# Altium footprint library SIM_Sockets.PCBLIB: 16 footprints
Each footprint in its own frame and in the unit in brackets; x right, y up, seen from the top. Pads: shape width x height; smd on the part's side, far side on the other; paste and mask are expansions set on the pad; w line width, h text height; cw(c..) or ccw(c..) is an arc to the next point about the centre after c.
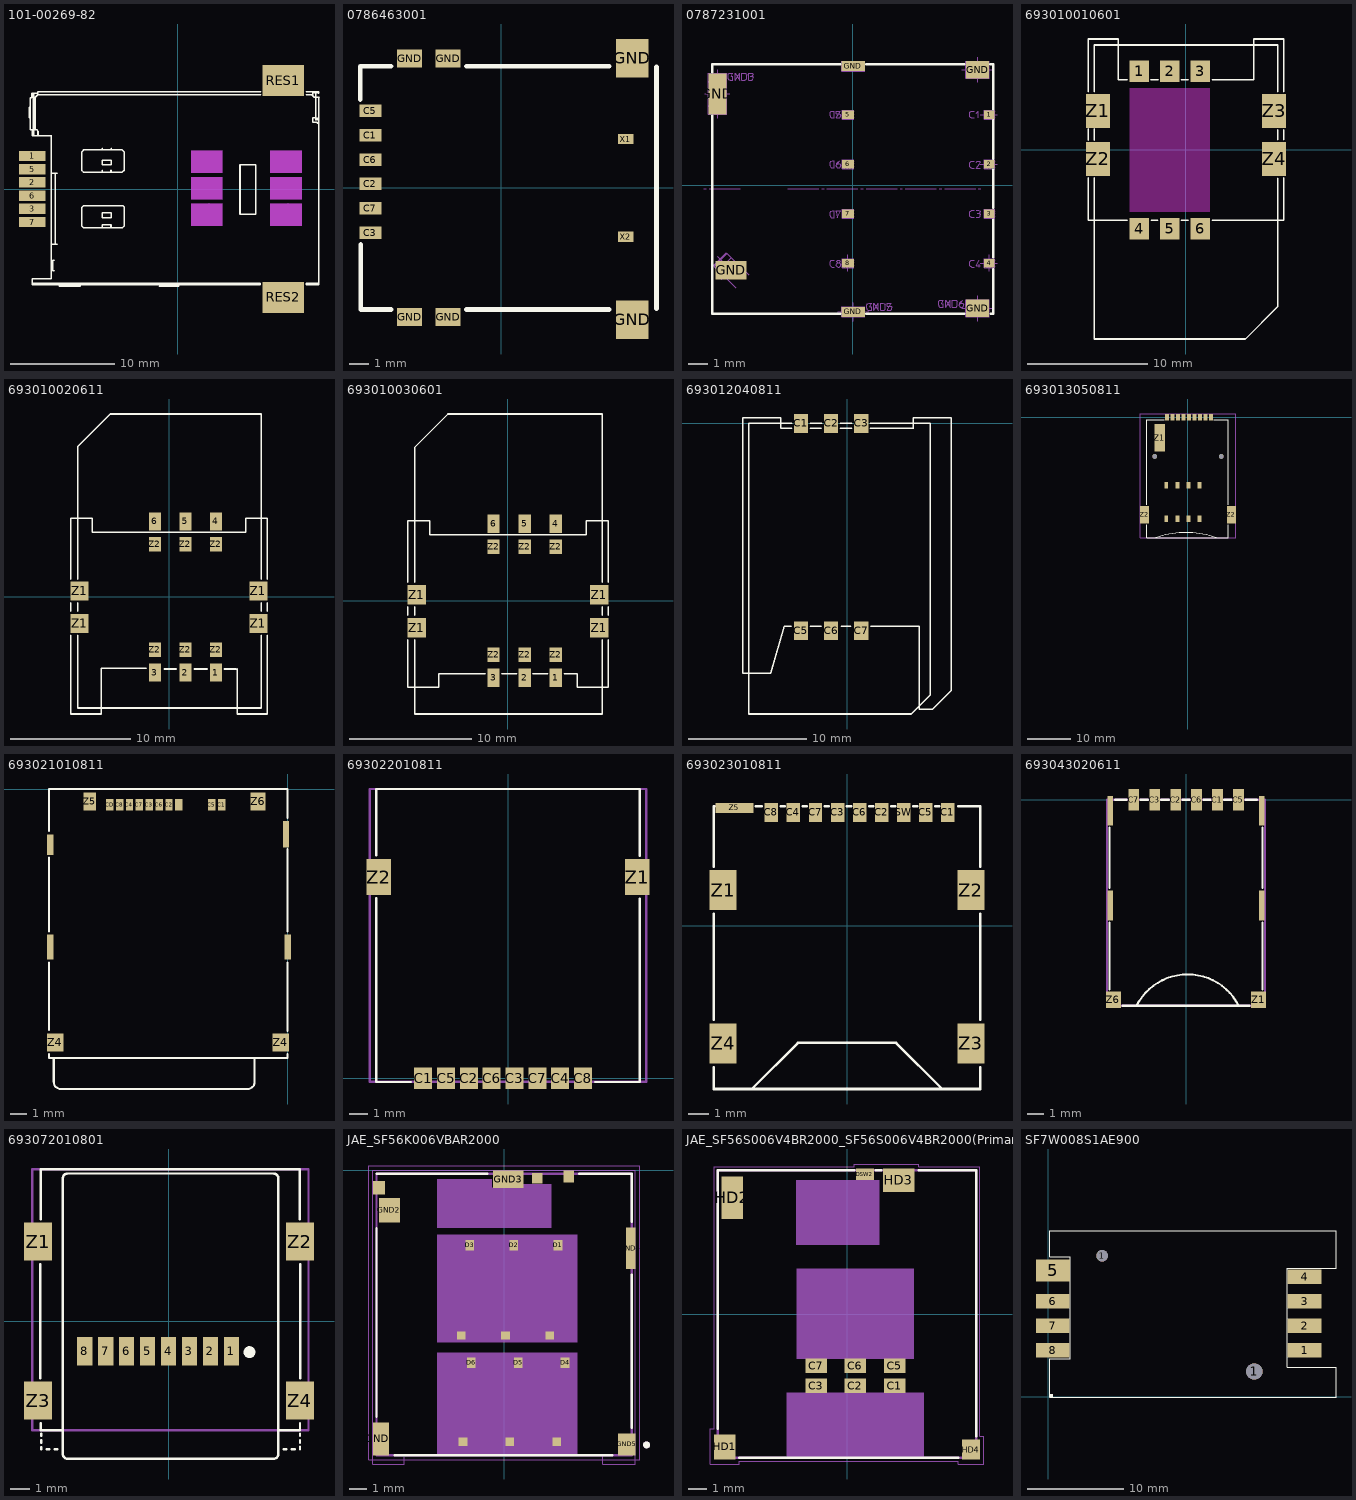
[diagram p0: the footprints below, top view; thin cyan lines are the x and y axes]

## 101-00269-82 [mm]
pads (8):
  rect 2.54x1 smd: 1(-13.97,3.175) 2(-13.97,0.635) 3(-13.97,-1.905) 5(-13.97,1.905) 6(-13.97,-0.635) 7(-13.97,-3.175)
  rect 4x3 smd: RES1(10.16,10.414) RES2(10.16,-10.414)
Top Overlay:
  lines w0.152: -14.275,6.833 -14.275,7.849 ; -13.97,-9.042 7.95,-9.042 7.95,-9.195 -13.97,-9.195 -13.97,-8.611 -12.141,-8.611 -12.141,5.105 -12.167,5.131 -13.411,5.131 ; -13.792,5.156 -13.818,5.131 ; -12.141,-5.309 -11.582,-5.309 -11.76,-5.309 -11.76,1.499 ; -12.141,1.499 -11.582,1.499 ; -11.862,-7.874 -12.014,-7.874 -12.014,-6.858 -11.862,-6.858 ; -11.354,-9.322 -9.347,-9.322 ; -7.239,-3.658 -7.239,-3.429 -6.401,-3.429 -6.401,-3.708 ; -7.239,1.702 -7.239,1.803 ; -7.239,3.81 -7.239,3.912 ; -6.426,1.676 -6.401,1.702 -6.401,1.803 ; -6.375,3.785 -6.375,3.912 ; -1.778,-9.347 0.076,-9.347 0.127,-9.296 ; 7.976,9.068 -13.437,9.068 ; 7.976,9.347 -13.437,9.347 -13.437,9.068 ; 12.37,9.068 12.878,9.068 12.979,8.966 ; 12.37,9.347 13.538,9.347 13.538,9.22 13.513,9.246 13.005,9.246 12.979,9.22 12.979,8.966 ; 13.31,6.807 13.564,6.807 13.437,6.68 13.513,6.68 13.538,6.655 13.284,6.655 13.259,6.68 13.259,9.246 13.284,9.22 13.284,6.833 12.979,6.833 12.979,6.426 13.411,6.426 13.411,6.299 13.564,6.299 ; 13.513,-9.042 12.37,-9.042 12.37,-9.195 13.564,-9.195 13.564,6.299 ; -13.818,5.131 -13.97,5.131 -13.97,5.639 -13.995,5.664 -13.97,5.69 -13.691,5.69 ; -13.818,5.131 -13.843,5.156 -13.843,9.22 -13.83,9.207 -13.437,9.207 -13.449,9.195 -13.995,9.195 -13.995,8.788 -14.148,8.788 -14.148,5.69 -13.691,5.69 ; -13.818,5.131 -13.411,5.131 ; -13.691,5.69 -13.538,5.69 -13.411,5.563 -13.411,5.131 ; -13.691,5.69 -13.691,8.814 -13.437,9.068 ; 12.979,8.966 13.132,8.814 13.589,8.814 13.564,8.788 13.564,6.299 ; -9.22,-3.556 -9.068,-3.708 -5.283,-3.708 -5.131,-3.556 -5.131,-1.727 -5.258,-1.6 -9.042,-1.6 -9.22,-1.778 -9.22,-3.556 ; -9.195,1.778 -9.042,1.626 -5.309,1.626 -5.131,1.803 -5.131,3.556 -5.334,3.759 -9.017,3.759 -9.195,3.581 -9.195,1.778 ; -7.239,-2.743 -6.375,-2.743 -6.375,-2.311 -6.401,-2.286 -7.239,-2.286 -7.239,-2.743 ; -7.239,2.311 -6.375,2.311 -6.375,2.743 -6.375,2.769 -7.239,2.769 -7.239,2.311 ; 5.994,-2.438 7.518,-2.438 7.518,2.311 5.994,2.311 5.994,-2.438
Mechanical 8 keep-out:
  rectangle: 1.27,1.524 4.318,3.683
  rectangle: 1.27,-1.016 4.318,1.143
  rectangle: 1.27,-3.556 4.318,-1.397
  rectangle: 8.89,1.524 11.938,3.683
  rectangle: 8.89,-1.016 11.938,1.143
  rectangle: 8.89,-3.556 11.938,-1.397
Mechanical 16:
  drawing of 931 lines, arcs and shapes, not listed
3D body "101-00306-82-SIM_holder.step": height 1.95, standoff 0, extent -14.097,-10.135 13.753,10.065

## 0786463001 [mm] "Conn Micro SIM Card SKT 6 POS 2.54mm Solder RA SMD Embossed T/R 0.5A/Contact"
pads (14):
  rect 1.15x0.65 smd: C1(-6.807,2.743) C2(-6.807,0.203) C3(-6.807,-2.337) C5(-6.807,4.013) C6(-6.807,1.473) C7(-6.807,-1.067)
  rect 1.3x0.95 smd: GND(-4.775,-6.725) GND(-4.775,6.725) GND(-2.769,-6.725) GND(-2.769,6.725)
  rect 1.7x2 smd: GND(6.807,-6.865) GND(6.807,6.745)
  rect 0.8x0.54 smd: X1(6.477,2.54) X2(6.477,-2.54)
Top Overlay:
  lines w0.254: -7.341,4.597 -7.341,6.325 -7.315,6.325 -5.74,6.325 ; -7.315,-2.947 -7.315,-6.325 -5.74,-6.325 ; -1.803,-6.325 5.613,-6.325 ; -1.803,6.324 5.613,6.325 ; 8.077,-6.274 8.077,6.299
3D body "786463001.stp": height 1.46, standoff 0.01, extent -7.369,-6.528 8.081,6.522

## 0787231001 [mm]
pads (14):
  rect 0.54x0.45 smd: 1(7.002,3.616) 2(7.002,1.076) 3(7.002,-1.464) 4(7.002,-4.004)
  rect 0.6x0.45 smd: 5(-0.25,3.616) 6(-0.25,1.076) 7(-0.25,-1.464) 8(-0.25,-4.004)
  rect 0.94x2.1 smd: GND(-6.943,4.683)
  rect 1.6x0.94 smd: GND(-6.244,-4.36)
  rect 1.2x0.52 smd: GND(0.017,-6.493) GND(0.017,6.105)
  rect 1.2x0.89 smd: GND(6.392,-6.303) GND(6.392,5.927)
Top Overlay:
  lines w0.127: -7.212,-2.2 -7.212,-6.587 -0.657,-6.587 ; -7.212,-2.175 -7.212,3.556 ; -7.212,5.8 -7.212,6.205 ; -7.203,6.205 -0.644,6.205 ; -5.898,6.205 -5.79,6.205 ; -5.645,6.205 -5.536,6.205 ; -5.382,6.205 -4.222,6.205 ; -4.077,6.205 -3.969,6.205 ; -3.815,6.205 -3.715,6.205 ; -3.561,6.205 -2.402,6.205 ; -2.247,6.205 -2.148,6.205 ; -1.994,6.205 -1.885,6.205 ; 0.679,6.205 5.721,6.205 ; 0.692,-6.587 4.545,-6.587 ; 4.547,-6.587 5.721,-6.587 ; 7.057,6.205 7.192,6.205 ; 7.069,-6.587 7.192,-6.587 7.192,-4.298 ; 7.192,-5.545 7.192,-5.463 ; 7.192,-5.337 7.192,-5.255 ; 7.192,-3.706 7.192,-1.762 ; 7.192,-1.169 7.192,0.788 ; 7.192,1.368 7.192,3.324 ; 7.192,3.904 7.192,6.196 ; 7.192,4.873 7.192,4.955 ; 7.192,5.082 7.192,5.154
Mechanical 113:
  drawing of 527 lines, arcs and shapes, not listed
3D body "787231001.stp": height 1.33, standoff -0.01, extent -7.243,-6.581 7.177,6.219

## 693010010601 [mm] "WR-CRD Mini SIM_Standard Header 6 pins    1.7 Heigth"
height 1.7
pads (10):
  rect 1.6x1.8 smd: 1(-3.9,6.55) 2(-1.36,6.55) 3(1.18,6.55) 4(-3.9,-6.55) 5(-1.36,-6.55) 6(1.18,-6.55)
  rect 2x2.8 smd: Z1(-7.35,3.25) Z2(-7.35,-0.75) Z3(7.35,3.25) Z4(7.35,-0.75)
Top Overlay:
  lines w0.127: -8.15,-2.3 -8.15,-5.85 -4.9,-5.85 ; -8.15,0.8 -8.15,1.75 ; -8.15,4.85 -8.15,9.25 -5.65,9.25 -5.65,5.85 -4.9,5.85 ; -7.65,-2.3 -7.65,-15.75 4.95,-15.75 7.65,-13.05 7.65,-2.35 ; -7.65,0.8 -7.65,1.75 ; -7.65,4.85 -7.65,8.75 7.65,8.75 7.65,4.85 ; -2.95,5.85 -2.3,5.85 ; -2.9,-5.85 -2.35,-5.85 ; -0.4,-5.85 0.2,-5.85 ; -0.4,5.85 0.2,5.85 ; 2.2,-5.85 8.15,-5.85 8.15,-2.3 ; 2.2,5.85 5.65,5.85 5.65,9.25 8.15,9.25 8.15,4.85 ; 7.65,0.85 7.65,1.7 ; 8.15,0.85 8.15,1.7
Keep-Out Layer:
  rectangle: -4.7,-5.15 1.98,5.15
3D body "693010010601.stp": height 1.71, standoff -0.04, extent -8.15,-6.85 8.15,9.25

## 693010020611 [mm] "WR-CRD Mini SIM_header_Shielded_6 pins    1.8 Heigth"
height 1.8
pads (16):
  rect 1x1.5 smd: 1(3.9,-6.3) 2(1.36,-6.3) 3(-1.18,-6.3) 4(3.9,6.3) 5(1.36,6.3) 6(-1.18,6.3)
  rect 1.5x1.6 smd: Z1(-7.45,-2.2) Z1(-7.45,0.5) Z1(7.45,-2.2) Z1(7.45,0.5)
  rect 1x1.2 smd: Z2(-1.18,-4.4) Z2(-1.18,4.4) Z2(1.36,-4.4) Z2(1.36,4.4) Z2(3.9,-4.4) Z2(3.9,4.4)
Top Overlay:
  lines w0.127: -8.2,-3.2 -8.2,-9.75 -5.63,-9.75 -5.63,-5.95 -1.9,-5.95 ; -8.2,-1.2 -8.2,-0.5 ; -8.2,1.5 -8.2,6.55 -6.4,6.55 -6.4,5.4 6.4,5.4 6.4,6.55 8.2,6.55 8.2,1.5 ; -7.6,-3.2 -7.6,-9.25 7.7,-9.25 7.7,-3.2 ; -7.6,-1.2 -7.6,-0.5 ; -7.6,1.5 -7.6,12.55 -4.9,15.25 7.7,15.25 7.7,1.5 ; -0.4,-6 0.6,-6 ; 2.1,-6 3.2,-6 ; 4.6,-6 5.62,-6 ; 5.67,-6 5.67,-9.75 8.2,-9.75 8.2,-3.2 ; 7.7,-1.2 7.7,-0.5 ; 8.2,-1.2 8.2,-0.5
3D body "693010020611.stp": height 1.81, standoff -0.04, extent -8.2,-9.75 8.2,6.55

## 693010030601 [mm] "WR-CRD Mini SIM_Card Stop_header_Shielded_ W/O card stop   6 pins    1.8 Heigth"
height 1.8
pads (16):
  rect 1x1.5 smd: 1(3.9,-6.3) 2(1.36,-6.3) 3(-1.18,-6.3) 4(3.9,6.3) 5(1.36,6.3) 6(-1.18,6.3)
  rect 1.5x1.6 smd: Z1(-7.45,-2.2) Z1(-7.45,0.5) Z1(7.45,-2.2) Z1(7.45,0.5)
  rect 1x1.2 smd: Z2(-1.18,-4.4) Z2(-1.18,4.4) Z2(1.36,-4.4) Z2(1.36,4.4) Z2(3.9,-4.4) Z2(3.9,4.4)
Top Overlay:
  lines w0.127: -8.2,-3.2 -8.2,-7.05 -5.65,-7.05 -5.65,-5.95 -1.875,-5.95 ; -8.2,-1.2 -8.2,-0.5 ; -8.2,1.5 -8.2,6.55 -6.4,6.55 -6.4,5.4 6.4,5.4 6.4,6.55 8.2,6.55 8.2,1.5 ; -7.6,-3.2 -7.6,-9.25 7.7,-9.25 7.7,-3.2 ; -7.6,-1.2 -7.6,-0.5 ; -7.6,1.5 -7.6,12.55 -4.9,15.25 7.7,15.25 7.7,1.5 ; -0.525,-5.95 0.7,-5.95 ; 2.025,-5.95 3.225,-5.95 ; 4.6,-5.95 5.65,-5.95 5.65,-7.05 8.2,-7.05 8.2,-3.2 ; 7.7,-1.2 7.7,-0.5 ; 8.2,-1.2 8.2,-0.5
3D body "693010030611.stp": height 1.81, standoff -0.04, extent -8.2,-7.05 8.2,6.55

## 693012040811 [mm] "WR-CRD mini SIM_Hinge type_6 pins_with cover shell_Housing Height 1.80mm"
height 1.8
pads (6):
  rect 1.2x1.6 smd: C1(-3.9,0) C2(-1.36,0) C3(1.18,0) C5(-3.9,-17.48) C6(-1.36,-17.48) C7(1.18,-17.48)
Top Overlay:
  lines w0.127: -4.707,-17.093 -5.325,-17.093 -6.449,-21.05 -8.82,-21.05 -8.82,0.5 -5.62,0.5 -5.62,-0.4 -4.7,-0.4 ; -4.7,0 -8.32,0 -8.32,-24.5 5.4,-24.5 6.98,-22.92 6.98,0 1.96,0 ; -3.1,-17.1 -2.2,-17.1 ; -3.1,-0.4 -2.18,-0.4 ; -3.1,0 -2.16,0 ; -0.6,0 0.4,0 ; -0.58,-0.4 0.4,-0.4 ; -0.5,-17.1 0.3,-17.1 ; 1.96,-0.4 5.58,-0.4 ; 2,-17.1 6.08,-17.1 6.08,-24.1 7.2,-24.1 8.78,-22.52 8.78,0.5 5.58,0.5 5.58,-0.4 ; 5.58,-0.4 5.58,-0.4
3D body "693012040811.stp": height 1.85, standoff 0, extent -8.82,-24.1 8.78,0.5

## 693013050811 [mm] "WR-CRD Mega SIM_Push and Push_8 pins_with Card Detection_Housing Height 1.50mm"
height 1.5
pads (22):
  rect 0.9x1.5 smd: CD(-4.835,0) P1(5.325,0) P2(2.785,0) P3(0.245,0) P4(-2.295,0) P5(4.055,0) P6(1.515,0) P7(-1.025,0) P8(-3.565,0) ""(-4.995,-23.3) ""(-4.995,-15.7) ""(-2.455,-23.3) ""(-2.455,-15.7) ""(0.085,-23.3) ""(0.085,-15.7) ""(2.625,-23.3) ""(2.625,-15.7)
  rect 2.5x6.35 smd: Z1(-6.5,-4.725)
  rect 2x4.1 smd: Z2(-10,-22.43) Z2(10,-22.43)
  round 1.1 hole 1.1 unplated: ""(-7.65,-9) ""(7.65,-9)
Top Overlay:
  lines w0.127: -9.45,-24.75 -9.45,-27.73 9.25,-27.73 9.25,-24.75 ; -9.45,-20.1 -9.45,-0.63 -5.48,-0.63 ; -7.409,-27.744 cw(c-0.459,-47.419) 6.45,-27.73 ; 5.92,-0.63 9.25,-0.63 9.25,-20.15
Mechanical 15:
  lines w0.127: -11,-27.73 11,-27.73 11,0.75 -11,0.75 -11,-27.73
3D body "693013050811.stp": height 1.5, standoff -0.5, extent -10.6,-27.73 10.4,0.272

## 693021010811 [mm] "Micro SIM Push & Push Type SMT - with Card Detection - 1.25mm Height"
height 1.25
pads (18):
  rect 0.45x0.68 smd: C1(-4,-0.96) C2(-7.2,-0.96) C3(-8.4,-0.96) C4(-9.6,-0.96) C5(-4.6,-0.96) C6(-7.8,-0.96) C7(-9,-0.96) C8(-10.2,-0.96) CD(-10.8,-0.96) COM(-6.6,-0.96)
  rect 0.37x1.25 smd: Z1(-14.415,-3.375)
  rect 0.37x1.6 smd: Z2(-0.085,-2.74)
  rect 0.37x1.5 smd: Z3(0.015,-9.6) Z4(-14.415,-9.6)
  rect 1x1.1 smd: Z4(-14.1,-15.4) Z4(-0.4,-15.4)
  rect 0.75x1.1 smd: Z5(-12.02,-0.75)
  rect 0.9x1.1 smd: Z6(-1.79,-0.75)
Top Overlay:
  lines w0.127: -14.5,-16.1 -14.5,-16.345 0,-16.345 0,-16.1 ; -14.5,-14.65 -14.5,-10.55 ; -14.5,-8.65 -14.5,-4.15 ; -14.5,-2.55 -14.5,0 0,0 0,-1.75 ; -14.2,-17.8 -14.2,-16.345 ; -14.2,-17.794 ccw(c-13.775,-17.8) -13.781,-18.225 ; -13.775,-18.225 -2.425,-18.225 ; -2.42,-18.225 ccw(c-2.425,-17.8) -2,-17.794 ; -2,-17.8 -2,-16.345 ; 0,-14.7 0,-10.55 ; 0,-8.65 0,-3.65
3D body "693021010811.stp": height 1.34, standoff 0, extent -14.5,-16.584 0,0

## 693022010811 [mm]
pads (10):
  rect 1x1.2 smd: C1(-4.72,0) C2(-2.18,0) C3(0.36,0) C4(2.9,0) C5(-3.45,0) C6(-0.91,0) C7(1.63,0) C8(4.17,0)
  rect 1.35x2 smd: Z1(7.2,11.2) Z2(-7.2,11.2)
Top Overlay:
  lines w0.127: -7.33,10.025 -7.33,-0.21 -5.415,-0.21 ; -7.33,12.395 -7.33,16.1 7.33,16.1 7.33,12.37 ; 4.845,-0.21 7.33,-0.21 7.33,10.005
Mechanical 13:
  lines w0.127: -7.7,-0.2 7.7,-0.2 7.7,16.1 -7.7,16.1 -7.7,-0.2
3D body "693022010811.stp": height 2.07, standoff -0.06, extent -7.7,-0.21 7.7,16.09

## 693023010811 [mm]
pads (14):
  rect 0.67x0.95 smd: C1(5.03,5.65) C2(1.73,5.65) C3(-0.47,5.65) C4(-2.67,5.65) C5(3.93,5.65) C6(0.63,5.65) C7(-1.57,5.65) C8(-3.77,5.65) SW(2.83,5.65)
  rect 1.35x2 smd: Z1(-6.175,1.775) Z2(6.175,1.775) Z3(6.175,-5.875) Z4(-6.175,-5.875)
  rect 1.88x0.5 smd: Z5(-5.61,5.875)
Top Overlay:
  lines w0.127: -6.65,-7.05 -6.65,-8.145 6.65,-8.145 6.65,-7.05 ; -6.65,-4.7 -6.65,0.6 ; -6.65,2.95 -6.65,5.955 -6.605,5.955 ; -4.75,-8.145 -2.45,-5.845 2.45,-5.845 4.75,-8.145 ; -4.55,5.95 -4.25,5.95 ; -3.3,5.95 -3.1,5.95 ; -2.2,5.95 -2,5.95 ; -1.1,5.95 -0.9,5.95 ; 0,5.95 0.2,5.95 ; 1.1,5.95 1.3,5.95 ; 2.2,5.95 2.4,5.95 ; 3.3,5.95 3.5,5.95 ; 4.4,5.95 4.6,5.95 ; 5.555,5.955 6.65,5.955 6.65,2.95 ; 6.65,-4.7 6.65,0.6
3D body "693023010811.stp": height 1.27, standoff 0, extent -6.65,-8.145 6.65,5.955

## 693043020611 [mm]
pads (12):
  rect 0.65x1.3 smd: C1(1.91,0) C2(-0.63,0) C3(-1.9,0) C5(3.18,0) C6(0.64,0) C7(-3.17,0)
  rect 0.9x1 smd: Z1(4.4,-12.14) Z6(-4.4,-12.14)
  rect 0.35x1.8 smd: Z2(4.595,-6.42) Z3(4.595,-0.67) Z4(-4.596,-0.67) Z5(-4.596,-6.42)
Top Overlay:
  lines w0.127: -4.65,-11.5 -4.65,-7.45 ; -4.65,-5.35 -4.65,-1.7 ; -4.3,0 -3.6,0 ; -3.85,-12.5 3.85,-12.5 ; -3,-12.5 cw(c0.1,-14.076) 3.2,-12.5 ; -2.75,0 -2.3,0 ; -1.5,0 -1.05,0 ; -0.2,0 0.2,0 ; 1.05,0 1.5,0 ; 2.3,0 2.75,0 ; 3.6,0 4.3,0 ; 4.65,-11.5 4.65,-7.45 ; 4.65,-5.35 4.65,-1.7
Mechanical 15:
  lines w0.127: -4.8,-12.5 4.8,-12.5 4.8,0 -4.8,0 -4.8,-12.5
3D body "693043020611.stp": height 1.2, standoff -0.01, extent -4.801,-12.5 4.8,0

## 693072010801 [mm] "WR-CRD Micro SD_Hinge_8 pins"
height 1.75
pads (12):
  rect 0.8x1.5 smd: 1(3.275,-1.575) 2(2.175,-1.575) 3(1.075,-1.575) 4(-0.025,-1.575) 5(-1.125,-1.575) 6(-2.225,-1.575) 7(-3.325,-1.575) 8(-4.425,-1.575)
  rect 1.45x2 smd: Z1(-6.875,4.175) Z2(6.875,4.175) Z3(-6.875,-4.175) Z4(6.875,-4.175)
Top Overlay:
  circle w0.32: c4.225,-1.625 r0.15
  lines w0.127: -6.75,-3 -6.75,3 ; -6.725,-5.35 -6.725,-5.725 -5.575,-5.725 ; -6.725,5.35 -6.725,7.975 6.875,7.975 6.875,5.35 ; -6.704,-6.727 -6.704,-6.606 ; -6.704,-6.377 -6.704,-6.256 ; -6.704,-6.025 -6.704,-5.915 ; -6.42,-6.728 -6.279,-6.728 ; -5.997,-6.728 -5.855,-6.728 ; 5.495,-7.225 ccw(c5.495,-6.975) 5.745,-6.975 5.745,-6.725 5.745,7.5 ccw(c5.495,7.5) 5.495,7.75 ; 5.5,-7.225 -5.325,-7.225 cw(c-5.325,-6.975) -5.575,-6.975 -5.575,-6.725 -5.575,7.5 cw(c-5.325,7.5) -5.325,7.75 5.5,7.75 ; 5.747,-5.725 6.876,-5.725 6.876,-5.349 ; 6.027,-6.725 6.169,-6.725 ; 6.451,-6.725 6.592,-6.725 ; 6.876,-6.724 6.876,-6.603 ; 6.876,-6.374 6.876,-6.253 ; 6.876,-6.022 6.876,-5.912 ; 6.9,-3 6.9,3
Mechanical 13:
  lines w0.127: -7.175,-5.725 -7.175,7.975 7.325,7.975 7.325,-5.725 -7.175,-5.725
3D body "693072010801.stp": height 1.78, standoff 0.01, extent -7.175,-5.725 7.325,7.975

## JAE_SF56K006VBAR2000 [mm]
pads (20):
  rect 0.5x0.5 smd paste-1 mask+0.05: C1(3.03,-15.625) C2(0.33,-15.625) C3(-2.37,-15.625)
  rect 0.5x0.45 smd: C5(2.62,-9.505) C6(0.08,-9.505) C7(-2.46,-9.505)
  rect 0.5x0.6 smd paste-1: D1(3.1,-4.31) D2(0.56,-4.31) D3(-1.98,-4.31) D4(3.51,-11.08) D5(0.81,-11.08) D6(-1.89,-11.08)
  rect 0.7x0.8 smd: DSW1(-7.2,-1)
  rect 0.6x0.6 smd: DSW2(1.91,-0.45)
  rect 0.92x1.9 smd: GND1(-7.09,-15.45)
  rect 1.2x1.4 smd: GND2(-6.6,-2.3)
  rect 1.75x1.02 smd: GND3(0.24,-0.51)
  rect 0.52x2.4 smd: GND4(7.29,-4.49)
  rect 1x1.25 smd: GND5(7.05,-15.775)
  rect 0.6x0.7 smd: GND6(3.71,-0.35)
Top Overlay:
  circle w0.2: c8.2,-15.8 r0.1
  lines w0.127: -7.35,-14.18 -7.35,-3.32 ; -7.35,-0.2 -0.96,-0.2 ; -6.31,-16.4 6.23,-16.4 ; 4.33,-0.2 7.35,-0.2 7.35,-2.97 ; 7.35,-14.83 7.35,-6.01
Mechanical 1:
  lines w0: -7.55,-16.9 -5.76,-16.9 -5.76,-16.4 5.68,-16.4 5.68,-16.9 7.55,-16.9
Mechanical 13:
  circle w0.2: c8.2,-15.8 r0.1
  lines w0.01: -7.55,-16.9 -5.76,-16.9 -5.76,-16.4 5.68,-16.4 5.68,-16.9 7.55,-16.9 7.55,0 -7.55,0 -7.55,-16.9
  lines w0.127: -7.35,-16.4 7.35,-16.4 7.35,-0.2 -7.35,-0.2 -7.35,-16.4
Mechanical 15:
  lines w0.05: -7.8,-16.65 7.8,-16.65 7.8,0.25 -7.8,0.25 -7.8,-16.65
Mechanical 16:
  region: -3.85,-3.3 -3.85,-0.5 -0.7,-0.5 -0.7,-1 1.1,-1 1.1,-0.8 2.7,-0.8 2.7,-3.3
  region: -3.85,-3.7 4.2,-3.7 4.2,-9.9 -3.85,-9.9
  region: 4.2,-10.5 4.2,-16.4 -3.85,-16.4 -3.85,-10.5
3D body "step_temp.STEP": height 1.27, standoff -0.05, extent -7.35,-16.5 7.35,-0.3

## JAE_SF56S006V4BR2000_SF56S006V4BR2000(Primary) [mm]
pads (11):
  rect 1.2x0.8 smd: C1(2.66,-3.99) C2(0.47,-3.99) C3(-1.72,-3.99) C5(2.66,-2.89) C6(0.47,-2.89) C7(-1.72,-2.89)
  rect 1x0.65 smd: DSW2(1,7.775)
  rect 1.2x1.4 smd: HD1(-6.8,-7.4)
  rect 1.2x2.35 smd: HD2(-6.4,6.475)
  rect 1.75x1.3 smd: HD3(2.87,7.45)
  rect 1x1.1 smd: HD4(6.9,-7.55)
Top Overlay:
  lines w0.127: -7.2,-6.4 -7.2,8 0.4,8 ; -6,-8 6.2,-8 ; 1.6,8 1.8,8 1.8,8.001 1.905,8.001 ; 4,8 7.2,8 7.2,-6.8
Mechanical 4:
  region: -2.812,7.45 1.8,7.45 1.8,3.867 -2.812,3.867
  region: -2.804,7.45 1.8,7.45 1.8,3.856 -2.804,3.856
  region: -2.792,2.51 3.72,2.51 3.72,-2.5 -2.792,-2.5
  region: -2.789,2.51 3.72,2.51 3.72,-2.498 -2.789,-2.498
  region: -3.338,-4.39 4.27,-4.39 4.27,-7.909 -3.338,-7.909
  region: -3.344,-4.39 4.27,-4.39 4.27,-7.924 -3.344,-7.924
  region: -2.812,7.45 1.8,7.45 1.8,3.867 -2.812,3.867
  region: -2.804,7.45 1.8,7.45 1.8,3.856 -2.804,3.856
  region: -2.792,2.51 3.72,2.51 3.72,-2.5 -2.792,-2.5
  region: -2.789,2.51 3.72,2.51 3.72,-2.498 -2.789,-2.498
  region: -3.338,-4.39 4.27,-4.39 4.27,-7.909 -3.338,-7.909
  region: -3.344,-4.39 4.27,-4.39 4.27,-7.924 -3.344,-7.924
  lines w0.127: -7.2,-8 -7.2,8 ; -7.2,-8 7.2,-8 ; -7.2,-8 -7.2,8 ; -7.2,-8 7.2,-8 ; -7.2,8 7.2,8 ; -7.2,8 7.2,8 ; 7.2,-8 7.2,8 ; 7.2,-8 7.2,8
Mechanical 16:
  lines w0.05: -7.6,-8.35 -6,-8.35 -6,-8.2 6.2,-8.2 6.2,-8.35 7.6,-8.35 7.6,-6.8 7.4,-6.8 7.4,8.2 4,8.2 4,8.35 0.4,8.35 0.4,8.2 -7.4,8.2 -7.4,-6.4 -7.6,-6.4 -7.6,-8.35
3D body "SF56S006V4BR2000--3DModel-STEP-56544.STEP": height 1.26, standoff 0.01, extent -7.2,-8 7.2,8

## SF7W008S1AE900 [mil]
pads (10):
  round 47.24 hole 47.24: 1(220.47,574.8)
  round 66.93 hole 66.93: 1(842.52,102.36)
  rect 137.8x59.06 smd: 1(1047.56,188.58) 2(1047.56,288.58) 3(1047.56,388.58) 4(1047.56,488.58) 6(19.37,388.58) 7(19.37,288.58) 8(19.37,188.58)
  rect 137.8x89.06 smd: 5(20,515)
Top Overlay:
  region: 9,-1 19,-1 19,9 9,9
  lines w5: 6,570 90.55,570 90.55,153.54 7,153.54 7,-3 1176,-3 1176,120 976.38,120 976.38,523.62 1176,523.62 1176,677.17 6,677.17 6,570
3D body "sim_socket1.step": height 102.36, standoff -27.56, extent 10.14,-4.59 1177.07,672.58